# Altium footprint library BARKO_PCBLIB.PcbLib: 531 footprints (part 7 of 34)
Each footprint in its own frame and in the unit in brackets; x right, y up, seen from the top. Pads: shape width x height; smd on the part's side, far side on the other; paste and mask are expansions set on the pad; w line width, h text height; cw(c..) or ccw(c..) is an arc to the next point about the centre after c.
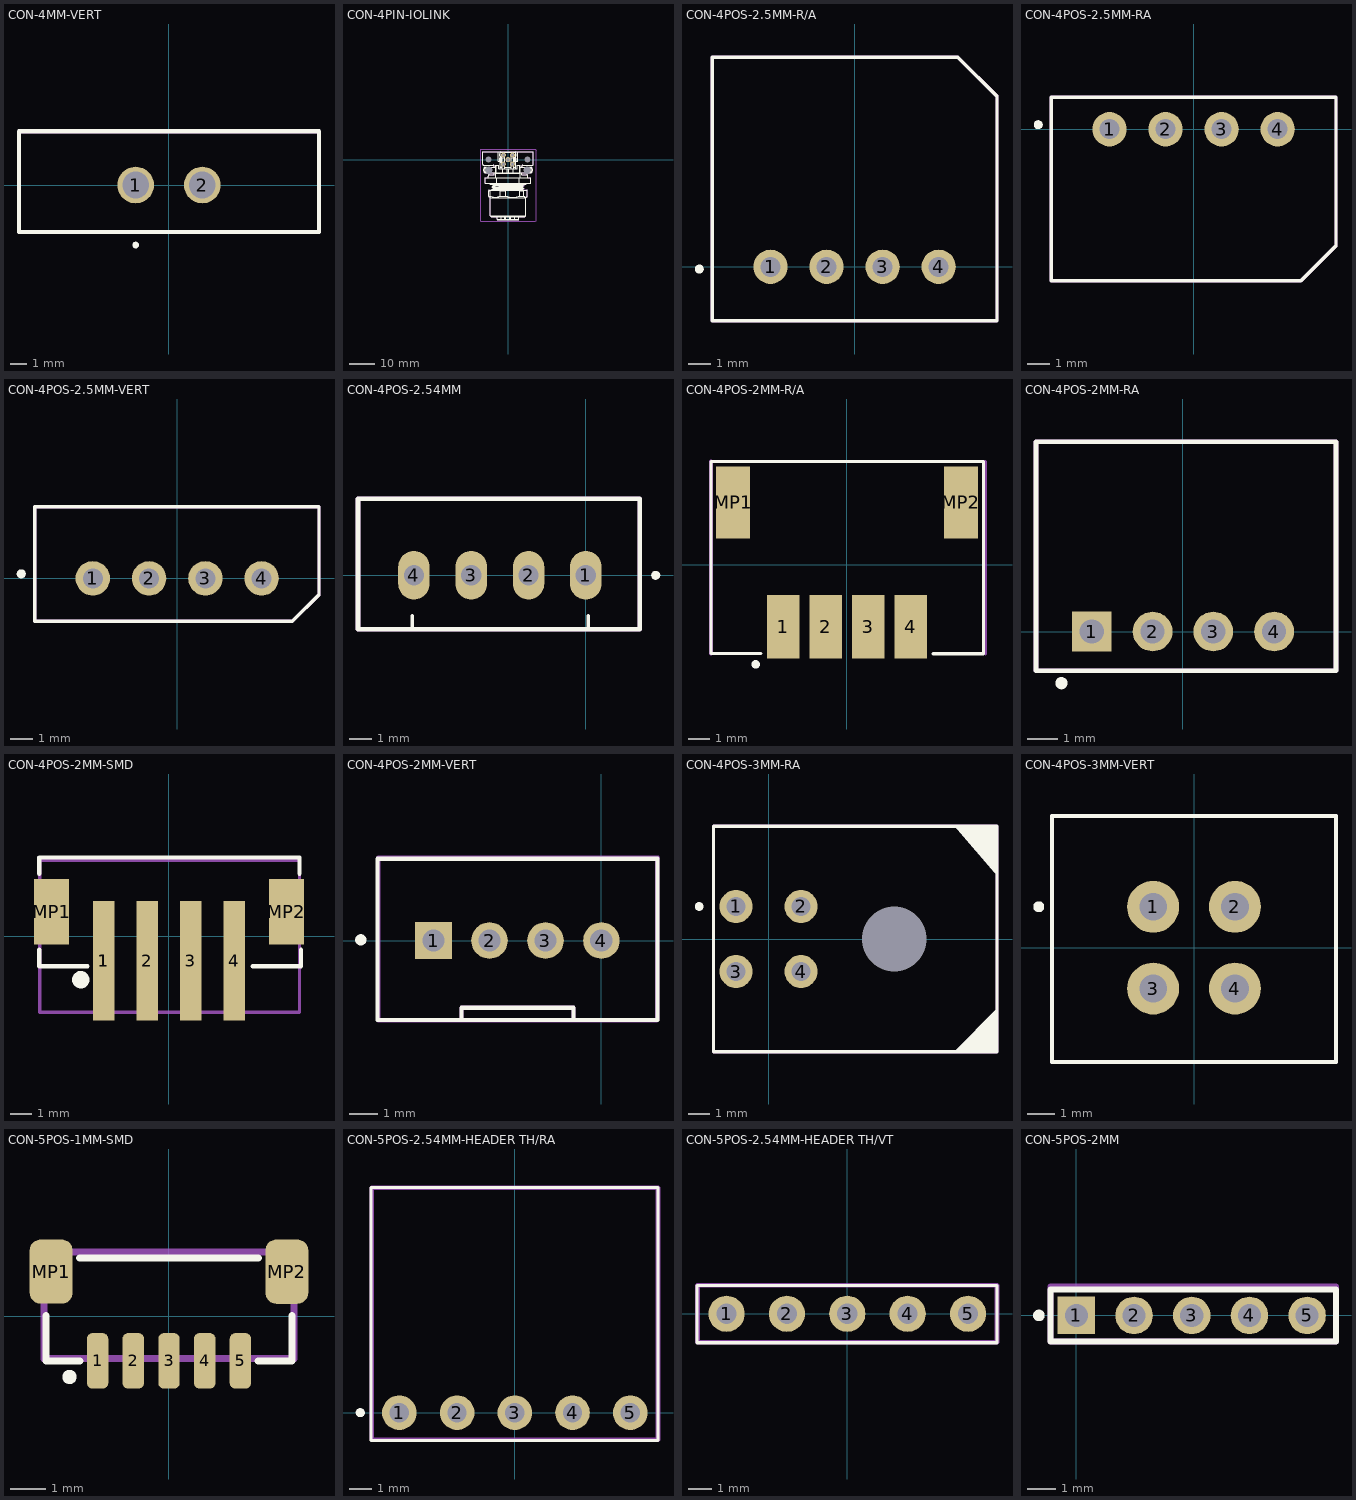
[diagram p6: the footprints below, top view; thin cyan lines are the x and y axes]

## CON-4MM-VERT [mm]
pads (2):
  round 2.2 hole 1.6: 1(-2,0) 2(2,0)
Top Overlay:
  circle w0.2: c-2,-3.6 r0.1
  lines w0.254: -9,-2.825 9,-2.825 9,3.225 -9,3.225 -9,-2.825
ASM Top:
  lines w0.2: -9,-2.8 -9,3.2 9,3.2 9,-2.8 -9,-2.8
  text ".designator" at -1.6,-0.2 h0.8
3D body "CON-HARWIN.stp": height 5.6, standoff -3.3, extent -9,-2.825 9,3.225

## CON-4PIN-IOLINK [mm]
height 32
pads (9):
  round 1.9 hole 1.3: 1(-1.77,1.77) 2(1.77,1.77) 3(1.77,-1.77) 4(-1.77,-1.77) 5(0,0)
  round 0 hole 2.35 unplated: MH1(-7.5,0) MH2(7.5,0)
  round 0 hole 2.8 unplated: MH3(-7.5,-4) MH4(7.5,-4)
Top Overlay:
  drawing of 442 lines, arcs and shapes, not listed
Mechanical 15:
  lines w0.2: -10.5,3.237 -10.5,3.043 -10.5,3.943 -9.912,3.943 ; -10.5,3.343 -10.5,-23.257 -10.5,-24.057 10.6,-24.057 10.9,-23.757 10.9,3.643 10.6,3.943 -10.1,3.943
ASM Top:
  lines w0.2: -9.9,3.1 9.854,3.1 9.906,3.048 ; -8.144,-9.144 -7.118,-9.144 ; -7.581,-14.171 -7.581,-12.139 ; -7.565,-12.124 -7.565,-12.065 -7.347,-11.847 -6.188,-11.847 -6.093,-11.751 ; -7.558,-14.2 ccw(c-6.142,-12.953) -7.514,-14.248 ; -7.528,-14.263 -6.864,-14.882 -6.864,-21.893 -6.559,-22.198 -4.171,-22.198 -4.171,-23.165 ccw(c-3.968,-23.165) -3.968,-23.368 3.957,-23.368 ccw(c3.957,-23.165) 4.16,-23.165 4.16,-22.198 6.553,-22.198 ; -7.433,-11.938 cw(c-6.111,-13.023) -7.363,-11.858 ; -6.216,-9.652 -6.61,-9.652 cw(c-6.61,-9.144) -7.118,-9.144 ; -6.215,-10.67 -5.552,-11.053 ; -6.213,-9.655 -5.552,-10.037 -5.552,-10.274 ; -6.211,-10.664 -5.545,-10.279 ; -6.102,-11.747 -6.102,-11.62 ; -6.095,-11.613 -5.545,-11.295 ; -5.546,-11.288 -5.546,-11.049 ; -5.289,-5.086 -5.289,-5.893 -7.219,-5.893 ccw(c-7.219,-6.401) -7.727,-6.401 -7.727,-7.112 -8.804,-7.112 -8.804,-9.144 -7.118,-9.144 ; -5.289,-5.08 -9.129,-5.08 cw(c-8.134,-4.064) -9.129,-3.048 -5.289,-3.048 -5.289,-2.743 ccw(c-5.797,-2.743) -5.797,-2.235 -9.404,-2.235 cw(c-9.404,-1.727) -9.912,-1.727 -9.912,3.048 -3.054,3.048 ; -2.739,3.033 2.727,3.033 ; 3.042,3.048 9.9,3.048 9.9,-1.727 cw(c9.392,-1.727) 9.392,-2.235 5.786,-2.235 ccw(c5.786,-2.743) 5.278,-2.743 5.278,-3.048 9.118,-3.048 cw(c8.122,-4.064) 9.118,-5.08 5.278,-5.08 5.278,-5.893 7.208,-5.893 cw(c7.208,-6.401) 7.716,-6.401 7.716,-7.112 8.793,-7.112 8.793,-9.144 7.106,-9.144 cw(c6.598,-9.144) 6.598,-9.652 5.381,-9.652 6.233,-10.145 5.533,-10.549 ; 5.539,-10.787 5.539,-10.549 ; 5.54,-10.791 6.21,-11.178 ; 6.208,-11.175 5.533,-11.565 5.533,-11.789 7.23,-11.789 7.565,-12.124 ; 6.548,-22.198 6.852,-21.893 6.852,-14.882 7.582,-14.202 ; 7.55,-12.11 7.57,-12.139 7.57,-14.171
  text ".designator" at -2.4,-4.4 h0.8
3D body "c-t4145515041-001-a-3d.stp": height 16.01, standoff -3.59, extent -9.75,-22.967 9.75,3.033

## CON-4POS-2.5MM-R/A [mil] "CONN HEADER R/A 4POS 2.5MM"
pads (4):
  round 60 hole 35: 1(-147,0) 2(-49,0) 3(49,0) 4(147,0)
Top Overlay:
  circle w7.87: c-271.65,-3.94 r3.94
  lines w6: -249,-94.02 249,-94.02 249,298.24 180.59,366.65 -249,366.65 -249,-94.02
ASM Top:
  lines w6: -249,-94.65 -249,366.65 180.59,366.65 249,298.24 249,-94.65 -249,-94.65
  text ".designator" at -62.99,90.55 h31.5
3D body "User Library-jst-s4b-xh-a.STEP": height 240.66, standoff -133.36, extent -245.07,-90.23 243.12,362.53

## CON-4POS-2.5MM-RA [mil]
pads (4):
  round 60 hole 35: 1(-147,0) 2(-49,0) 3(49,0) 4(147,0)
Top Overlay:
  circle w7.87: c-271.65,7.87 r3.94
  lines w6: -249,-265 -249,56 249,56 249,-203.76 187.76,-265 -249,-265
ASM Top:
  lines w6: -249,-265 -249,56 249,56 249,-203.76 187.76,-265 -249,-265
  text ".designator" at -47.24,-51.18 h31.5
3D body "022057045.stp": height 196.46, standoff -134.25, extent -244,-260.03 244.19,51

## CON-4POS-2.5MM-VERT [mil]
pads (4):
  round 60 hole 35: 1(-147,0) 2(-49,0) 3(49,0) 4(147,0)
Top Overlay:
  circle w7.87: c-271.65,7.87 r3.94
  lines w6: -248,-75 -248,125 247,125 247,-28.59 200.59,-75 -248,-75
ASM Top:
  lines w6: -248,-75 -248,125 247,125 247,-28.59 200.59,-75 -248,-75
  text ".designator" at -51.18,47.24 h31.5
3D body "022035045.stp": height 231.14, standoff -138.94, extent -242.09,-70.92 246.1,122

## CON-4POS-2.54MM [mil] "2.54 mm (100mil)"
height 236.22
pads (4):
  oval 55x85 hole 35.43: 1(0,0) 2(-100,0) 3(-200,0) 4(-300,0)
Top Overlay:
  circle w7.87: c122.05,0 r3.94
  lines w5.98: -303.15,-94.49 -303.15,-70.87 ; 3.94,-94.49 3.94,-70.87
  lines w7.87: -397.64,-94.49 -397.64,133.86 94.49,133.86 94.49,-94.49 -397.64,-94.49
ASM Top:
  lines w7.87: -397.64,-94.49 94.49,-94.49 94.49,133.86 -397.64,133.86 -397.64,-94.49
  text ".designator" at -251.97,3.94 h31.5
3D body "JST XH 4 B4B-XH-A.STEP": height 275.59, standoff -135.83, extent -395.67,-93.51 92.52,132.87

## CON-4POS-2MM-R/A [mm] "CONN HEADER SMD R/A 4POS 2MM"
pads (6):
  rect 1.524x3 smd: 1(-3.003,-2.924) 2(-0.996,-2.924) 3(1.004,-2.924) 4(3.004,-2.924)
  rect 1.6x3.4 smd: MP1(-5.364,2.924) MP2(5.365,2.924)
Top Overlay:
  circle w0.2: c-4.3,-4.7 r0.1
  lines w0.152: -4.046,-4.194 -6.404,-4.194 -6.404,4.854 6.43,4.854 6.43,-4.196 4.046,-4.196
ASM Top:
  lines w0.152: -6.404,4.854 6.526,4.854 6.526,2.609 6.526,-1.996 6.526,-4.196
  lines w0.2: -6.404,-4.194 -6.404,4.854
  text ".designator" at -2.604,0.204 h0.8
3D body "S4B-PH-SM4-TB.stp": height 4.81, standoff 0.01, extent -5.895,-4.206 6.006,4.394

## CON-4POS-2MM-RA [mm]
pads (4):
  rect 1.308x1.308 hole 0.8: 1(-3,0)
  round 1.308 hole 0.8: 2(-1,0) 3(1,0) 4(3,0)
Top Overlay:
  circle w0.2: c-4,-1.7 r0.1
  lines w0.152: -4.838,-1.295 -4.838,6.248 5.039,6.248 5.039,-1.295 -4.838,-1.295
ASM Top:
  lines w0.152: -4.838,6.198 -4.788,6.248 5.039,6.248 5.039,-1.295 -4.838,-1.295 -4.838,6.248
  text ".designator" at -0.368,2.184 h0.8
3D body "S4B-PH-K-S.STEP": height 4.81, standoff -3.39, extent -4.861,-1.377 5.039,6.223

## CON-4POS-2MM-SMD [mm]
pads (7):
  rect 1x5.5 smd: 1(-3,-1.125) 1(-3,-1.125) 2(-1,-1.125) 3(1,-1.125) 4(3,-1.125)
  rect 1.6x3 smd: MP1(-5.4,1.125) MP2(5.4,1.125)
Top Overlay:
  circle w0.4: c-4.058,-1.999 r0.2
  lines w0.2: -5.975,-0.625 -5.975,-1.375 -3.75,-1.375 ; -5.975,2.875 -5.975,3.625 6,3.625 6,2.875 ; 3.85,-1.375 6.075,-1.375 6.075,-0.625
ASM Top:
  lines w0.152: -5.95,3.5 -5.95,-3.5 6,-3.5 6,3.5 ; -5.95,3.5 -5.95,3.5 ; -5.95,3.5 6,3.5 ; 6,3.5 6,3.5
  text ".designator" at -2.4,-0.4 h0.8
3D body "B4B-PH-SM4-TB.STEP": height 6.61, standoff 0.01, extent -5.95,-3.5 6,3.5

## CON-4POS-2MM-VERT [mm]
pads (4):
  rect 1.308x1.308 hole 0.8: 1(-6,0)
  round 1.308 hole 0.8: 2(-4,0) 3(-2,0) 4(0,0)
Top Overlay:
  circle w0.2: c-8.6,0.025 r0.1
  lines w0.15: -5,-2.845 -8,-2.845 -8,2.921 2,2.921 2,-2.845 -1,-2.845 ; -5,-2.845 -1,-2.845 ; -5,-2.845 -5,-2.4 -3.8,-2.4 -2.2,-2.4 -1,-2.4 -1,-2.845
ASM Top:
  lines w0.15: -5,-2.845 -5,-2.4 -1,-2.4 -1,-2.845
  lines w0.152: 1.97,-2.845 1.996,-2.819 ; 1.97,-2.845 -7.978,-2.845 -7.978,2.955 2.022,2.955 1.996,2.93 1.996,-2.819 ; 1.97,-2.845 1.996,-2.819
  text ".designator" at -4.727,-0.457 h0.8
3D body "c-1735446-4-c-3d.stp": height 6.1, standoff -3.37, extent -7.974,-2.844 2.026,2.956

## CON-4POS-3MM-RA [mil]
pads (5):
  round 60 hole 35: 1(-59.06,59.06) 2(59.06,59.06) 3(-59.06,-59.06) 4(59.06,-59.06)
  round 1 hole 118 unplated: MH1(228.35,0)
Top Overlay:
  circle w7.87: c-125.98,59.06 r3.94
  region: 415,-127 415,-205 337,-205
  region: 338.66,205 415,205 415,114.67
  lines w6: 345,205 415,205 ; 355,205 415,205 ; 415,205 -100,205 -100,-60 -100,-205 415,-205 415,205
ASM Top:
  lines w6: -100,-205 415,-205 415,205 -100,205 -100,-60 -100,-205
  text ".designator" at -55,114 h31.5
3D body "430450400.stp": height 340.35, standoff -130.12, extent -70,-199 411.89,200.6

## CON-4POS-3MM-VERT [mm]
pads (4):
  round 1.905 hole 1.016: 1(-1.5,1.5) 2(1.5,1.5) 3(-1.5,-1.5) 4(1.5,-1.5)
Top Overlay:
  circle w0.2: c-5.7,1.5 r0.1
  lines w0.152: -5.207,-4.191 5.207,-4.191 5.207,4.826 -5.207,4.826 -5.207,-4.191
ASM Top:
  lines w0.152: -5.207,-4.191 -5.207,4.826 5.207,4.826 5.207,-4.191 -5.207,-4.191
  text ".designator" at -4.775,2.718 h0.8
3D body "430450412.stp": height 10.03, standoff -3.06, extent -5.07,-4.064 5.08,4.706

## CON-5POS-1MM-SMD [mm]
pads (7):
  rrect50% 0.6x1.55 smd mask+0.05: 1(-2,-1.25) 2(-1,-1.25) 3(0,-1.25) 4(1,-1.25) 5(2,-1.25)
  rrect50% 1.2x1.8 smd mask+0.05: MP1(-3.3,1.25) MP2(3.3,1.249)
Top Overlay:
  circle w0.2: c-2.788,-1.7 r0.1
  lines w0.2: -3.442,0.015 -3.442,-1.251 -2.5,-1.251 ; -2.5,1.631 2.5,1.631 ; 2.5,-1.251 3.44,-1.251 ; 3.441,-1.253 3.441,0.013
ASM Top:
  lines w0.2: -3.5,-1.2 -3.5,1.8 3.5,1.8 3.5,-1.2 3.485,-1.185 -3.5,-1.185
  text ".designator" at -1.3,0 h0.8
3D body "5013310507.stp": height 5.5, standoff -0.04, extent -3.62,-1.91 3.62,1.94

## CON-5POS-2.54MM-HEADER TH/RA [mil]
pads (5):
  round 60 hole 33.46: 1(-200,0) 2(-100,0) 3(0,0) 4(100,0) 5(200,0)
Top Overlay:
  circle w7.87: c-267.72,0 r3.94
  lines w5: -249,-48 248,-48 248,389.76 -249,389.76 -249,-48
ASM Top:
  lines w7.87: -248.03,389.57 247.84,389.57 248.03,389.76 248.03,-47.24 -248.03,-47.24 -248.03,389.76
  text ".designator" at -51.18,188.98 h31.5
3D body "TSW-105-08-G-S-RA.stp": height 119.5, standoff -89.5, extent -250,-13.44 250,389.06

## CON-5POS-2.54MM-HEADER TH/VT [mil]
pads (5):
  round 60 hole 33.46: 1(-200,0) 2(-100,0) 3(0,0) 4(100,0) 5(200,0)
Top Overlay:
  lines w5: -249,-48 -249,47 248,47 248,-48 -249,-48
ASM Top:
  lines w7.87: -248.03,-47.24 -248.03,47.24 248.03,47.24 248.03,-47.24 -248.03,-47.24
  text ".designator" at -43.31,-11.81 h31.5
3D body "Header_Male_5Pin.STEP": height 336.22, standoff -118.11, extent -251,-50 249,48.03

## CON-5POS-2MM [mm] "Connector; Header; 5 Position"
pads (5):
  rect 1.3x1.3 hole 0.8: 1(0,0)
  round 1.3 hole 0.8: 2(2,0) 3(4,0) 4(6,0) 5(8,0)
Top Overlay:
  circle w0.2: c-1.3,0 r0.1
  lines w0.2: -0.9,-0.9 9,-0.9 9,0.9 -0.9,0.9 -0.9,-0.9
ASM Top:
  lines w0.2: -0.9,-0.9 9,-0.9 9,1 -0.9,1 -0.9,-0.9
  text ".designator" at 3.372,-0.169 h0.8